# Altium footprint library lib_protel_HC_BOINA.PCBLIB: 726 footprints (part 16 of 46)
Each footprint in its own frame and in the unit in brackets; x right, y up, seen from the top. Pads: shape width x height; smd on the part's side, far side on the other; paste and mask are expansions set on the pad; w line width, h text height; cw(c..) or ccw(c..) is an arc to the next point about the centre after c.
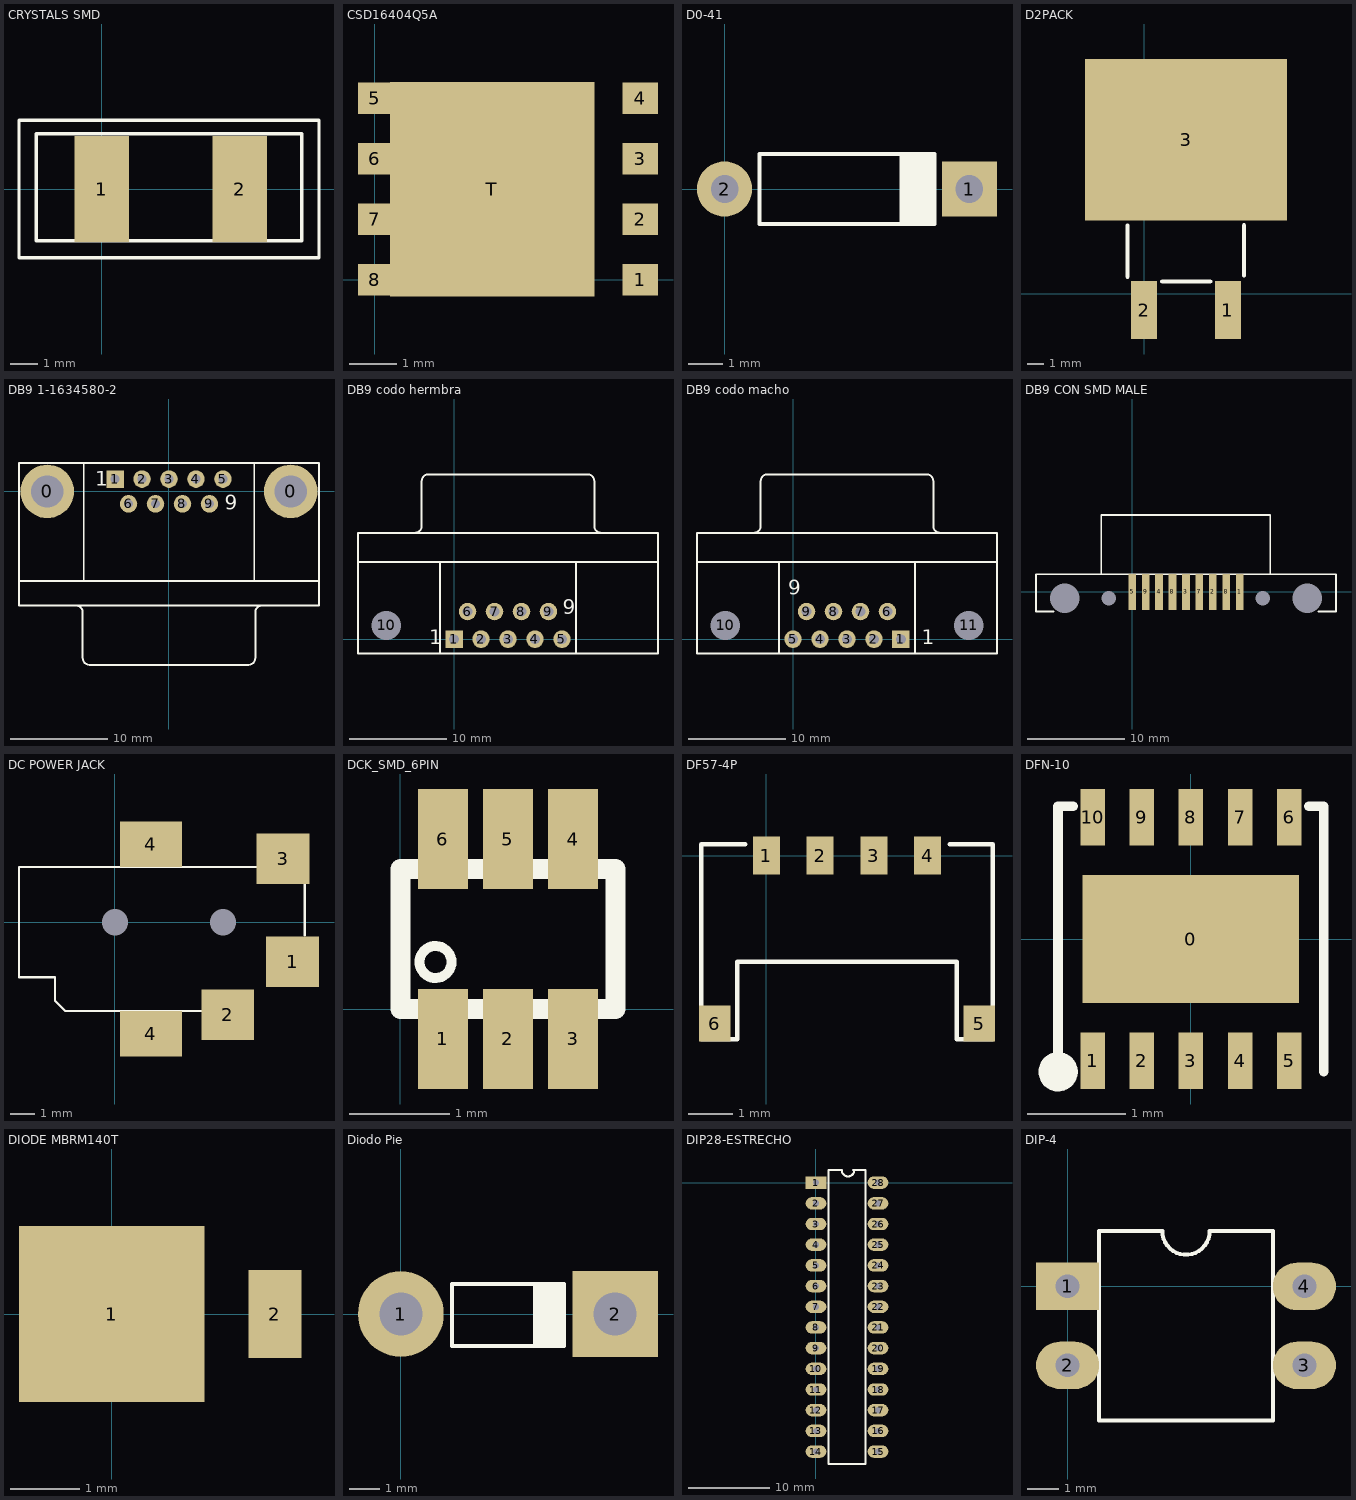
[diagram p15: the footprints below, top view; thin cyan lines are the x and y axes]

## CRYSTALS SMD [mm] "RELOJ SMD"
height 2.5
pads (2):
  rect 2x3.9 smd: 1(0,0) 2(5.08,0)
Top Overlay:
  lines w0.127: -3.048,-2.54 -3.048,2.54 8.001,2.54 8.001,-2.54 -3.048,-2.54 ; -2.413,-1.905 -2.413,2.032 7.366,2.032 7.366,-1.905 -2.286,-1.905 -2.413,-1.905

## CSD16404Q5A [mm] "N-MOSFET"
height 1
pads (9):
  rect 0.75x0.67 smd: 1(5.575,0) 2(5.575,1.27) 3(5.575,2.54) 4(5.575,3.81)
  rect 0.7x0.67 smd: 5(0,3.81) 6(0,2.54) 7(0,1.27) 8(0,0)
  rect 4.3x4.5 smd: T(2.47,1.9)

## D0-41 [mm] "DIODO DE PROPOSITO GENERAL (1N400X)"
pads (2):
  rect 1.6x1.6 hole 0.8: 1(7.112,0)
  round 1.6 hole 0.8: 2(0,0)
Top Overlay:
  rectangle: 5.08,-1.016 6.096,1.016
  lines w0.127: 1.016,-1.016 6.096,-1.016 6.096,1.016 1.016,1.016 1.016,-1.016

## D2PACK [mm]
pads (3):
  rect 1.6x3.5 smd: 1(5.08,-1) 2(0,-1)
  rect 12.2x9.75 smd: 3(2.54,9.3)
Top Overlay:
  lines w0.25: -1,1.02 -1,4.12 ; 1.1,0.72 4.01,0.72 ; 6.04,1.09 6.04,4.13
3D body "SW3dPS-DPAK.STEP": height 4.77, standoff -0.25, extent -2.54,-1.916 7.62,13.348

## DB9 1-1634580-2 [mm]
pads (11):
  round 5.5 hole 3.3: 0(-12.495,0) 0(12.495,0)
  rect 1.8x1.8 hole 0.9: 1(-5.54,1.27)
  round 1.8 hole 0.9: 2(-2.77,1.27) 3(0,1.27) 4(2.77,1.27) 5(5.54,1.27) 6(-4.155,-1.27) 7(-1.385,-1.27) 8(1.385,-1.27) 9(4.155,-1.27)
Top Overlay:
  lines w0.2: -15.4,-11.705 -15.4,2.9 15.4,2.9 15.4,-11.7 -15.4,-11.7 ; -15.4,-9.2 15.4,-9.2 ; -9.56,-11.705 cw(c-9.56,-12.4) -8.865,-12.4 -8.865,-17.1 ; -8.86,-17.105 ccw(c-8.165,-17.105) -8.165,-17.8 8.165,-17.8 ccw(c8.165,-17.105) 8.86,-17.105 ; -8.75,-9.2 -8.75,2.9 ; 8.75,-9.2 8.75,2.9 ; 8.865,-17.1 8.865,-12.4 cw(c9.56,-12.4) 9.56,-11.705
  text "9" at 5.7,-1.9 h1.5
  text "1" at -7.55,0.6 h1.5

## DB9 codo hermbra [mm]
pads (10):
  rect 1.8x1.8 hole 1: 1(0,0)
  round 1.8 hole 1: 2(2.77,0) 3(5.54,0) 4(8.31,0) 5(11.08,0) 6(1.385,2.84) 7(4.155,2.84) 8(6.925,2.84) 9(9.695,2.84)
  oval 2.8x2 / inner round 0 / far side round 0 hole 3: 10(-6.955,1.42)
Top Overlay:
  lines w0.2: -9.86,7.92 20.94,7.92 ; -4.02,10.925 ccw(c-4.02,11.62) -3.325,11.62 -3.325,16.22 ; -3.32,16.225 cw(c-2.625,16.225) -2.625,16.92 13.705,16.92 cw(c13.705,16.225) 14.4,16.225 ; -1.46,-1.48 -1.46,7.92 ; 12.54,-1.48 12.54,7.92 ; 14.405,16.22 14.405,11.62 ccw(c15.1,11.62) 15.1,10.925 ; -9.86,-1.48 -9.86,10.92 20.94,10.92 20.94,-1.48 -9.86,-1.48
  text "1" at -2.54,-0.508 h1.5
  text "9" at 11.176,2.54 h1.5

## DB9 codo macho [mm]
pads (11):
  rect 1.8x1.8 hole 1: 1(11.08,0)
  round 1.8 hole 1: 2(8.31,0) 3(5.54,0) 4(2.77,0) 5(0,0) 6(9.695,2.84) 7(6.925,2.84) 8(4.155,2.84) 9(1.385,2.84)
  oval 2.8x2 on Top hole 3: 10(-6.955,1.42) 11(18.035,1.42)
Top Overlay:
  lines w0.2: -9.86,7.92 20.94,7.92 ; -4.02,10.925 ccw(c-4.02,11.62) -3.325,11.62 -3.325,16.22 ; -3.32,16.225 cw(c-2.625,16.225) -2.625,16.92 13.705,16.92 cw(c13.705,16.225) 14.4,16.225 ; -1.46,-1.48 -1.46,7.92 ; 12.54,-1.48 12.54,7.92 ; 14.405,16.22 14.405,11.62 ccw(c15.1,11.62) 15.1,10.925 ; -9.86,-1.48 -9.86,10.92 20.94,10.92 20.94,-1.48 -9.86,-1.48
  text "1" at 13.208,-0.508 h1.5
  text "9" at -0.508,4.572 h1.5

## DB9 CON SMD MALE [mm] "CONECTOR SMD DB9 SERIAL MACHO"
height 12.55
pads (13):
  round 0 hole 1.499: 0(-2.413,-0.66) 0(13.477,-0.66)
  rect 0.8x3.7 smd: 1(11.074,0) 2(8.306,0) 3(5.537,0) 4(2.769,0) 5(0,0) 7(6.921,0) 8(4.153,0) 8(9.69,0) 9(1.384,0)
  round 0 hole 3.048: 10(-6.96,-0.66) 11(18.024,-0.66)
Top Overlay:
  lines w0.178: -8.08,-2.04 -9.92,-2.04 -9.92,1.81 21,1.81 21.01,1.8 21.01,-2.04 19.17,-2.04 ; -3.19,1.81 -3.19,7.92 14.24,7.92 14.24,1.81 -3.19,1.81

## DC POWER JACK [mm] "CONECTOR PJ-043-SMT"
height 4.6
pads (7):
  rect 0x0 hole 1.1: 0(0,0) 0(4.5,0)
  rect 2.2x2.1 smd: 1(7.4,-1.65) 2(4.7,-3.85) 3(7,2.65)
  rect 2.6x1.9 smd: 4(1.5,-4.65) 4(1.5,3.25)
Top Overlay:
  lines w0.1: 3.6,-3.7 -2.075,-3.7 -2.5,-3.275 -2.5,-2.3 -4,-2.3 -4,2.3 5.9,2.3 ; 7.9,-0.55 7.9,1.6

## DCK_SMD_6PIN [mm]
height 1.1
pads (6):
  rect 0.5x1 smd: 1(0.425,-0.3) 2(1.075,-0.3) 3(1.725,-0.3) 4(1.725,1.7) 5(1.075,1.7) 6(0.425,1.7)
Top Overlay:
  circle w0.1: c0.35,0.47 r0.16
  lines w0.203: 0,0 0,1.4 2.15,1.4 2.15,0 0,0

## DF57-4P [mm] "CONNECTOR"
height 1.4
pads (6):
  rect 0.6x0.85 smd: 1(0,0) 2(1.2,0) 3(2.4,0) 4(3.6,0)
  rect 0.7x0.8 smd: 5(4.75,-3.75) 6(-1.15,-3.75)
Top Overlay:
  lines w0.1: -0.475,0.25 -1.45,0.25 -1.45,-4.1 -0.65,-4.1 -0.65,-2.375 4.25,-2.375 4.25,-4.1 5.05,-4.1 5.05,0.25 4.1,0.25 ; 4.1,0.25 4.1,0.25

## DFN-10 [mm]
pads (11):
  rect 2.2x1.3 smd: 0(0,0)
  rect 0.25x0.575 smd: 1(-1,-1.237) 2(-0.5,-1.237) 3(0,-1.237) 4(0.5,-1.237) 5(1,-1.237) 6(1,1.238) 7(0.5,1.238) 8(0,1.238) 9(-0.5,1.238) 10(-1,1.238)
Top Overlay:
  circle w0.2: c-1.35,-1.35 r0.1
  lines w0.1: -1.2,-1.35 -1.35,-1.35 -1.35,1.35 -1.2,1.35 ; 1.2,1.35 1.35,1.35 1.35,-1.35
3D body "User Library-DFN-10.STEP": height 0.8, standoff 0, extent -1.5,-1.5 1.5,1.5

## DIODE MBRM140T [mm] "DIODE"
height 1.15
pads (2):
  rect 2.67x2.54 smd: 1(0,0)
  rect 0.762x1.27 smd: 2(2.351,0)

## Diodo Pie [mm] "DIODO DE PROPOSITO GENERAL"
pads (2):
  round 2.8 hole 1.4: 1(0,0)
  rect 2.8x2.8 hole 1.4: 2(7,0)
Top Overlay:
  rectangle: 4.32,-1.046 5.336,0.986
  lines w0.127: 1.67,-1.046 1.67,0.986 5.336,0.986 5.336,-1.046 1.67,-1.046

## DIP28-ESTRECHO [mil]
pads (28):
  rect 100x60 hole 30: 1(0,0)
  oval 100x60 hole 30: 2(0,-100) 3(0,-200) 4(0,-300) 5(0,-400) 6(0,-500) 7(0,-600) 8(0,-700) 9(0,-800) 10(0,-900) 11(0,-1000) 12(0,-1100) 13(0,-1200) 14(0,-1300) 15(300,-1300) 16(300,-1200) 17(300,-1100) 18(300,-1000) 19(300,-900) 20(300,-800) 21(300,-700) 22(300,-600) 23(300,-500) 24(300,-400) 25(300,-300) 26(300,-200) 27(300,-100) 28(300,0)
Top Overlay:
  lines w10: 120,60 60,60 60,-1360 240,-1360 240,60 180,60 ; 125,60 ccw(c155,60) 185,60

## DIP-4 [mil]
pads (4):
  rect 80x60 hole 30: 1(0,0)
  oval 80x60 hole 30: 2(0,-100) 3(300,-100) 4(300,0)
Top Overlay:
  lines w5: 40,-170 260,-170 260,70 180,70 cw(c150,70) 120,70 40,70 40,-170